# Altium footprint library Connector.PcbLib: 148 footprints (part 6 of 10)
Each footprint in its own frame and in the unit in brackets; x right, y up, seen from the top. Pads: shape width x height; smd on the part's side, far side on the other; paste and mask are expansions set on the pad; w line width, h text height; cw(c..) or ccw(c..) is an arc to the next point about the centre after c.
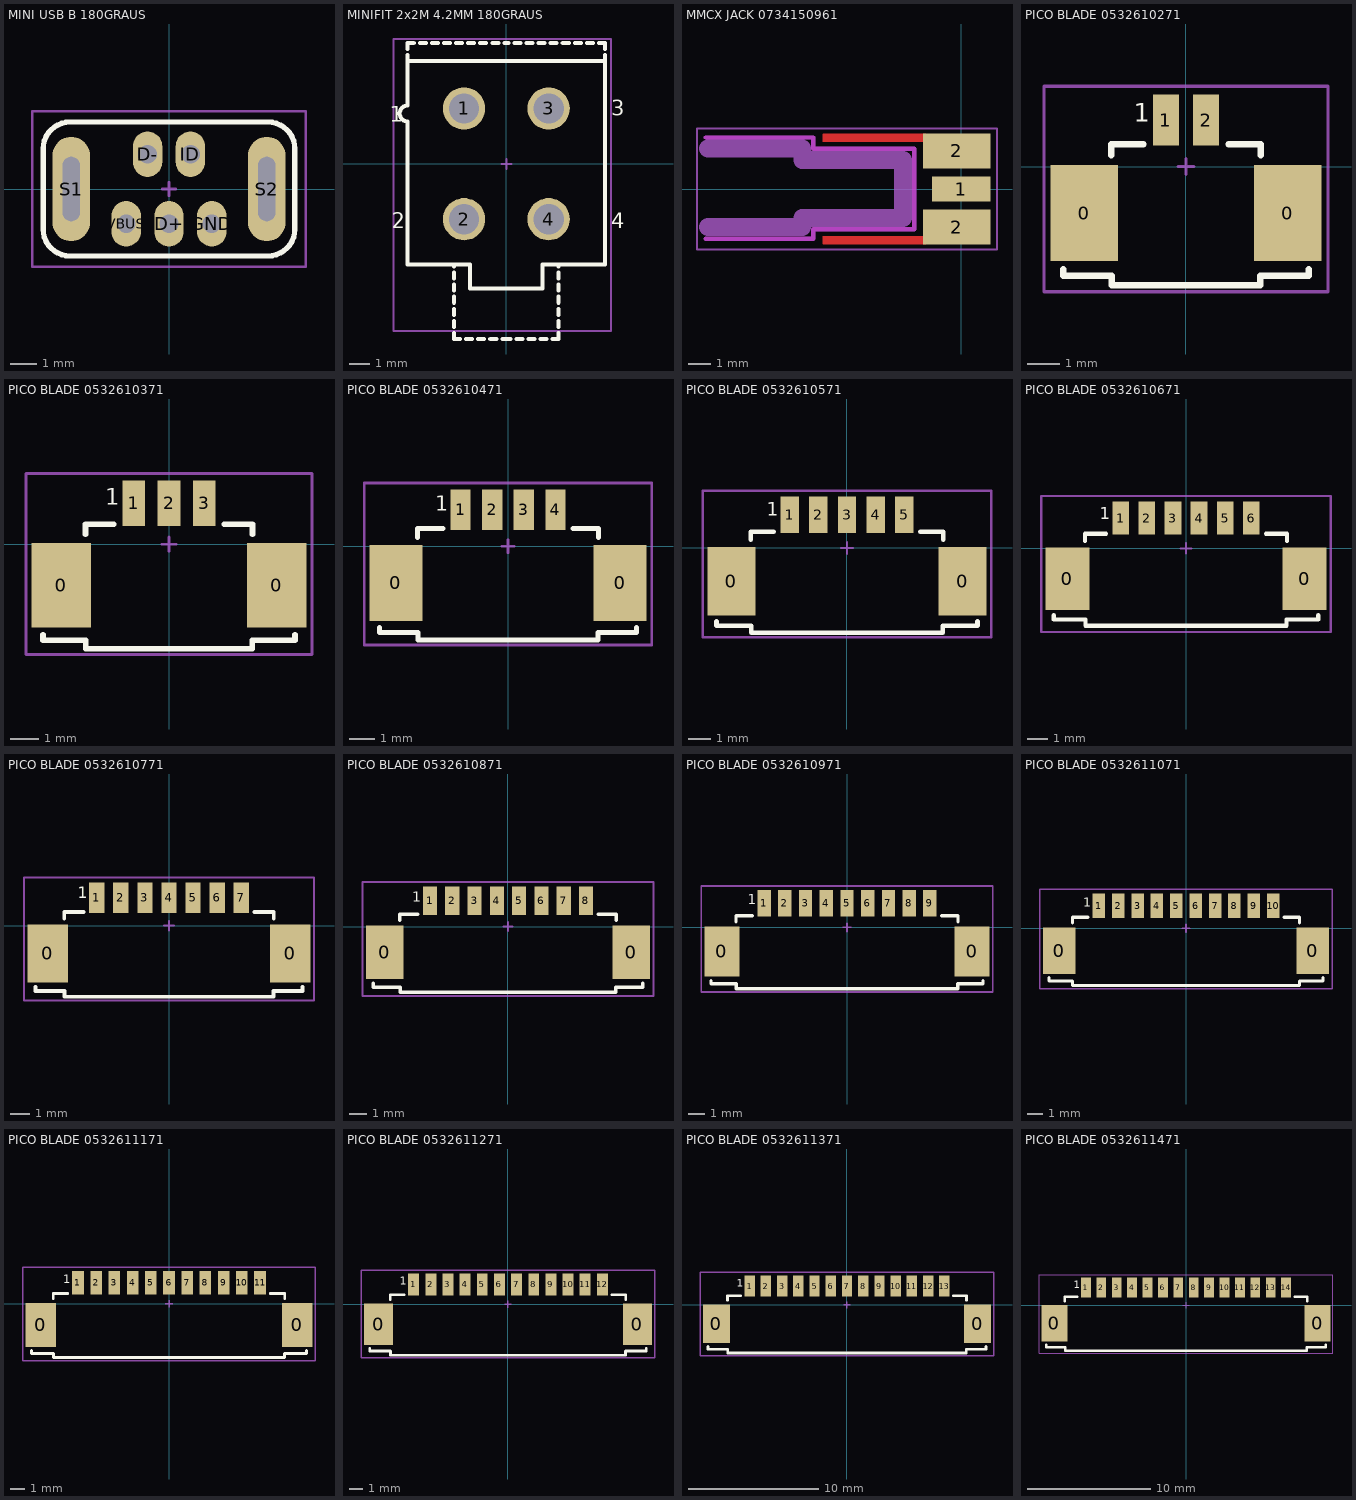
[diagram p5: the footprints below, top view; thin cyan lines are the x and y axes]

## MINI USB B 180GRAUS [mm]
height 6.7
pads (7):
  oval 1.1x1.7 hole 0.7: D+(0,-1.3) D-(-0.8,1.3) GND(1.6,-1.3) ID(0.8,1.3) VBUS(-1.6,-1.3)
  oval 1.4x3.9 hole 0.65 slot 2.4 at 90 deg: S1(-3.65,0) S2(3.65,0)
Top Overlay:
  lines w0.2: -4.7,-1.5 ccw(c-3.7,-1.5) -3.7,-2.5 0,-2.5 3.7,-2.5 ccw(c3.7,-1.5) 4.7,-1.5 4.7,0 4.7,1.5 ccw(c3.7,1.5) 3.7,2.5 0,2.5 -3.7,2.5 ccw(c-3.7,1.5) -4.7,1.5 -4.7,0 -4.7,-1.5
Mechanical 15:
  lines w0.1: -0.25,0 0.25,0 ; 0,-0.25 0,0.25 ; -5.1,-2.9 -5.1,2.9 5.1,2.9 5.1,-2.9 -5.1,-2.9
3D body "User Library-Mini USB UE25BEX510X.STEP": height 7.7, standoff -2.1, extent -3.85,-2.35 3.85,2.35

## MINIFIT 2x2M 4.2MM 180GRAUS [mm]
height 12.8
pads (4):
  round 2.1 hole 1.5: 1(-2.1,2.75) 2(-2.1,-2.75) 3(2.1,2.75) 4(2.1,-2.75)
Top Overlay:
  lines w0.2: -4.9,5.4 -4.9,5.1 ; -4.9,5.7 -4.9,6 -4.6,6 ; -4.3,6 -4,6 ; -3.7,6 -3.4,6 ; -3.1,6 -2.8,6 ; -2.6,-8.4 -2.6,-8.7 -2.3,-8.7 ; -2.6,-8.1 -2.6,-7.8 ; -2.6,-7.5 -2.6,-7.2 ; -2.6,-6.9 -2.6,-6.6 ; -2.6,-6.3 -2.6,-6 ; -2.6,-5.7 -2.6,-5.4 ; -2.6,-5.1 -2.6,-5 ; -2.5,6 -2.2,6 ; -2,-8.7 -1.7,-8.7 ; -1.9,6 -1.6,6 ; -1.4,-8.7 -1.1,-8.7 ; -1.3,6 -1,6 ; -0.8,-8.7 -0.5,-8.7 ; -0.7,6 -0.4,6 ; -0.2,-8.7 0.2,-8.7 ; -0.1,6 0.1,6 ; 0.4,6 0.7,6 ; 0.5,-8.7 0.8,-8.7 ; 1,6 1.3,6 ; 1.1,-8.7 1.4,-8.7 ; 1.6,6 1.9,6 ; 1.7,-8.7 2,-8.7 ; 2.2,6 2.5,6 ; 2.3,-8.7 2.6,-8.7 2.6,-8.4 ; 2.6,-8.1 2.6,-7.8 ; 2.6,-7.5 2.6,-7.2 ; 2.6,-6.9 2.6,-6.6 ; 2.6,-6.3 2.6,-6 ; 2.6,-5.7 2.6,-5.4 ; 2.6,-5.1 2.6,-5 ; 2.8,6 3.1,6 ; 3.4,6 3.7,6 ; 4,6 4.3,6 ; 4.6,6 4.9,6 4.9,5.7 ; 4.9,5.4 4.9,5.1 ; -4.9,5.1 -4.9,2.9 ccw(c-4.9,2.5) -4.9,2.1 -4.9,-5 -1.8,-5 -1.8,-6.2 1.8,-6.2 1.8,-5 4.9,-5 4.9,5.1 ; -4.9,5.1 4.9,5.1
  text "1" at -5.8,2.1 h0.76
  text "2" at -5.7,-3.2 h0.76
  text "3" at 5.2,2.4 h0.76
  text "4" at 5.2,-3.2 h0.76
Mechanical 15:
  lines w0.1: -0.25,0 0.25,0 ; 0,-0.25 0,0.25 ; -5.6,-8.3 5.2,-8.3 5.2,6.2 -5.6,6.2 -5.6,-8.3
3D body "c-1586037-4-b-3d.STEP": height 12.8, standoff -3.5, extent -5.2,-6.075 4.8,4.875
3D body "c-794954-4-d-3d.STEP": height 23.6, standoff 3.6, extent -4.8,-8.6 4.8,5.9

## MMCX JACK 0734150961 [mm]
pads (3):
  rect 2.6x1.1 smd: 1(0,0)
  rect 3x1.55 smd: 2(-0.2,-1.7) 2(-0.2,1.7)
Top Layer:
  rectangle: -6.2,-2.475 -1.6,-2.1
  rectangle: -6.2,2.1 -1.6,2.475
Keep-Out Layer:
  lines w0.2: -11.4,-2.225 -6.6,-2.225 -6.6,-1.8 -2.1,-1.8 -2.1,1.8 -6.6,1.8 -6.6,2.3 -11.4,2.3
Mechanical 1:
  lines w0.2: -11.4,-2.225 -6.6,-2.225 -6.6,-1.8 -2.1,-1.8 -2.1,1.8 -6.6,1.8 -6.6,2.3 -11.4,2.3
Mechanical 3:
  lines w0.8: -11.3,-1.7 -7.1,-1.7 -7.1,-1.3 -2.6,-1.3 -2.6,1.3 -7.1,1.3 -7.1,1.8 -11.3,1.8
Mechanical 15:
  lines w0.1: -0.25,0 0.25,0 ; 0,-0.25 0,0.25 ; -11.8,-2.7 -11.8,2.7 1.6,2.7 1.6,-2.7 -11.8,-2.7
3D body "User Library-mmcx-lr-smt.STEP": height 2.1, standoff -1.41, extent -6.35,-2.235 1.02,2.235

## PICO BLADE 0532610271 [mm]
height 3.4
pads (4):
  rect 2.1x3 smd: 0(-3.175,-1.45) 0(3.175,-1.45)
  rect 0.8x1.6 smd: 1(-0.625,1.45) 2(0.625,1.45)
Top Overlay:
  lines w0.2: -3.825,-3.2 -3.825,-3.4 -2.311,-3.4 -2.311,-3.7 2.311,-3.7 2.311,-3.4 3.825,-3.4 3.825,-3.2 ; -2.325,0.35 -2.325,0.7 -1.325,0.7 ; 1.325,0.7 2.325,0.7 2.325,0.35
  text "1" at -1.625,1.2 h1
Mechanical 15:
  lines w0.1: -0.25,0 0.25,0 ; 0,-0.25 0,0.25 ; -4.425,-3.9 -4.425,2.5 4.425,2.5 4.425,-3.9 -4.425,-3.9
3D body "User Library-molex 53261 white.step": height 3.5, standoff 0, extent -3.825,-3.6 3.825,1.6

## PICO BLADE 0532610371 [mm]
height 3.4
pads (5):
  rect 2.1x3 smd: 0(-3.8,-1.45) 0(3.8,-1.45)
  rect 0.8x1.6 smd: 1(-1.25,1.45) 2(0,1.45) 3(1.25,1.45)
Top Overlay:
  lines w0.2: -4.45,-3.2 -4.45,-3.4 -2.936,-3.4 -2.936,-3.7 2.936,-3.7 2.936,-3.4 4.45,-3.4 4.45,-3.2 ; -2.95,0.35 -2.95,0.7 -1.95,0.7 ; 1.95,0.7 2.95,0.7 2.95,0.35
  text "1" at -2.25,1.2 h1
Mechanical 15:
  lines w0.1: -0.25,0 0.25,0 ; 0,-0.25 0,0.25 ; -5.05,-3.9 -5.05,2.5 5.05,2.5 5.05,-3.9 -5.05,-3.9
3D body "User Library-molex 53261 white (1).step": height 3.5, standoff 0, extent -4.45,-3.6 4.45,1.6

## PICO BLADE 0532610471 [mm]
height 3.4
pads (6):
  rect 2.1x3 smd: 0(-4.425,-1.45) 0(4.425,-1.45)
  rect 0.8x1.6 smd: 1(-1.875,1.45) 2(-0.625,1.45) 3(0.625,1.45) 4(1.875,1.45)
Top Overlay:
  lines w0.2: -5.075,-3.2 -5.075,-3.4 -3.561,-3.4 -3.561,-3.7 3.561,-3.7 3.561,-3.4 5.075,-3.4 5.075,-3.2 ; -3.575,0.35 -3.575,0.7 -2.575,0.7 ; 2.575,0.7 3.575,0.7 3.575,0.35
  text "1" at -2.875,1.2 h1
Mechanical 15:
  lines w0.1: -0.25,0 0.25,0 ; 0,-0.25 0,0.25 ; -5.675,-3.9 -5.675,2.5 5.675,2.5 5.675,-3.9 -5.675,-3.9
3D body "User Library-molex 53261 white (2).step": height 3.5, standoff 0, extent -5.075,-3.6 5.075,1.6

## PICO BLADE 0532610571 [mm]
height 3.4
pads (7):
  rect 2.1x3 smd: 0(-5.05,-1.45) 0(5.05,-1.45)
  rect 0.8x1.6 smd: 1(-2.5,1.45) 2(-1.25,1.45) 3(0,1.45) 4(1.25,1.45) 5(2.5,1.45)
Top Overlay:
  lines w0.2: -5.7,-3.2 -5.7,-3.4 -4.186,-3.4 -4.186,-3.7 4.186,-3.7 4.186,-3.4 5.7,-3.4 5.7,-3.2 ; -4.2,0.35 -4.2,0.7 -3.2,0.7 ; 3.2,0.7 4.2,0.7 4.2,0.35
  text "1" at -3.5,1.2 h1
Mechanical 15:
  lines w0.1: -0.25,0 0.25,0 ; 0,-0.25 0,0.25 ; -6.3,-3.9 -6.3,2.5 6.3,2.5 6.3,-3.9 -6.3,-3.9
3D body "User Library-molex 53261 white (3).step": height 3.5, standoff 0, extent -5.7,-3.6 5.7,1.6

## PICO BLADE 0532610671 [mm]
height 3.4
pads (8):
  rect 2.1x3 smd: 0(-5.675,-1.45) 0(5.675,-1.45)
  rect 0.8x1.6 smd: 1(-3.125,1.45) 2(-1.875,1.45) 3(-0.625,1.45) 4(0.625,1.45) 5(1.875,1.45) 6(3.125,1.45)
Top Overlay:
  lines w0.2: -6.325,-3.2 -6.325,-3.4 -4.811,-3.4 -4.811,-3.7 4.811,-3.7 4.811,-3.4 6.325,-3.4 6.325,-3.2 ; -4.825,0.35 -4.825,0.7 -3.825,0.7 ; 3.825,0.7 4.825,0.7 4.825,0.35
  text "1" at -4.125,1.2 h1
Mechanical 15:
  lines w0.1: -0.25,0 0.25,0 ; 0,-0.25 0,0.25 ; -6.925,-4 6.925,-4 6.925,2.5 -6.925,2.5 -6.925,-4
3D body "User Library-molex 53261 white (4).step": height 3.5, standoff 0, extent -6.325,-3.6 6.325,1.6

## PICO BLADE 0532610771 [mm]
height 3.4
pads (9):
  rect 2.1x3 smd: 0(-6.3,-1.45) 0(6.3,-1.45)
  rect 0.8x1.6 smd: 1(-3.75,1.45) 2(-2.5,1.45) 3(-1.25,1.45) 4(0,1.45) 5(1.25,1.45) 6(2.5,1.45) 7(3.75,1.45)
Top Overlay:
  lines w0.2: -6.95,-3.2 -6.95,-3.4 -5.436,-3.4 -5.436,-3.7 5.436,-3.7 5.436,-3.4 6.95,-3.4 6.95,-3.2 ; -5.45,0.35 -5.45,0.7 -4.45,0.7 ; 4.45,0.7 5.45,0.7 5.45,0.35
  text "1" at -4.75,1.2 h1
Mechanical 15:
  lines w0.1: -0.25,0 0.25,0 ; 0,-0.25 0,0.25 ; -7.55,-3.9 -7.55,2.5 7.55,2.5 7.55,-3.9 -7.55,-3.9
3D body "User Library-molex 53261 white (5).step": height 3.5, standoff 0, extent -6.95,-3.6 6.95,1.6

## PICO BLADE 0532610871 [mm]
height 3.4
pads (10):
  rect 2.1x3 smd: 0(-6.925,-1.45) 0(6.925,-1.45)
  rect 0.8x1.6 smd: 1(-4.375,1.45) 2(-3.125,1.45) 3(-1.875,1.45) 4(-0.625,1.45) 5(0.625,1.45) 6(1.875,1.45) 7(3.125,1.45) 8(4.375,1.45)
Top Overlay:
  lines w0.2: -7.575,-3.2 -7.575,-3.4 -6.061,-3.4 -6.061,-3.7 6.061,-3.7 6.061,-3.4 7.575,-3.4 7.575,-3.2 ; -6.075,0.35 -6.075,0.7 -5.075,0.7 ; 5.075,0.7 6.075,0.7 6.075,0.35
  text "1" at -5.375,1.2 h1
Mechanical 15:
  lines w0.1: -0.25,0 0.25,0 ; 0,-0.25 0,0.25 ; -8.175,-3.9 -8.175,2.5 8.175,2.5 8.175,-3.9 -8.175,-3.9
3D body "User Library-molex 53261 white (6).step": height 3.5, standoff 0, extent -7.575,-3.6 7.575,1.6

## PICO BLADE 0532610971 [mm]
height 3.4
pads (11):
  rect 2.1x3 smd: 0(-7.55,-1.45) 0(7.55,-1.45)
  rect 0.8x1.6 smd: 1(-5,1.45) 2(-3.75,1.45) 3(-2.5,1.45) 4(-1.25,1.45) 5(0,1.45) 6(1.25,1.45) 7(2.5,1.45) 8(3.75,1.45) 9(5,1.45)
Top Overlay:
  lines w0.2: -8.2,-3.2 -8.2,-3.4 -6.686,-3.4 -6.686,-3.7 6.686,-3.7 6.686,-3.4 8.2,-3.4 8.2,-3.2 ; -6.7,0.35 -6.7,0.7 -5.7,0.7 ; 5.7,0.7 6.7,0.7 6.7,0.35
  text "1" at -6,1.2 h1
Mechanical 15:
  lines w0.1: -0.25,0 0.25,0 ; 0,-0.25 0,0.25 ; -8.8,-3.9 -8.8,2.5 8.8,2.5 8.8,-3.9 -8.8,-3.9
3D body "User Library-molex 53261 white (7).step": height 3.5, standoff 0, extent -8.2,-3.6 8.2,1.6

## PICO BLADE 0532611071 [mm]
height 3.4
pads (12):
  rect 2.1x3 smd: 0(-8.175,-1.45) 0(8.175,-1.45)
  rect 0.8x1.6 smd: 1(-5.625,1.45) 2(-4.375,1.45) 3(-3.125,1.45) 4(-1.875,1.45) 5(-0.625,1.45) 6(0.625,1.45) 7(1.875,1.45) 8(3.125,1.45) 9(4.375,1.45) 10(5.625,1.45)
Top Overlay:
  lines w0.2: -8.825,-3.2 -8.825,-3.4 -7.311,-3.4 -7.311,-3.7 7.311,-3.7 7.311,-3.4 8.825,-3.4 8.825,-3.2 ; -7.325,0.35 -7.325,0.7 -6.325,0.7 ; 6.325,0.7 7.325,0.7 7.325,0.35
  text "1" at -6.625,1.2 h1
Mechanical 15:
  lines w0.1: -0.25,0 0.25,0 ; 0,-0.25 0,0.25 ; -9.425,-3.9 9.425,-3.9 9.425,2.5 -9.425,2.5 -9.425,-3.9
3D body "User Library-molex 53261 white (8).step": height 3.5, standoff 0, extent -8.825,-3.6 8.825,1.6

## PICO BLADE 0532611171 [mm]
height 3.4
pads (13):
  rect 2.1x3 smd: 0(-8.8,-1.45) 0(8.8,-1.45)
  rect 0.8x1.6 smd: 1(-6.25,1.45) 2(-5,1.45) 3(-3.75,1.45) 4(-2.5,1.45) 5(-1.25,1.45) 6(0,1.45) 7(1.25,1.45) 8(2.5,1.45) 9(3.75,1.45) 10(5,1.45) 11(6.25,1.45)
Top Overlay:
  lines w0.2: -9.45,-3.2 -9.45,-3.4 -7.936,-3.4 -7.936,-3.7 7.936,-3.7 7.936,-3.4 9.45,-3.4 9.45,-3.2 ; -7.95,0.35 -7.95,0.7 -6.95,0.7 ; 6.95,0.7 7.95,0.7 7.95,0.35
  text "1" at -7.25,1.2 h1
Mechanical 15:
  lines w0.1: -0.25,0 0.25,0 ; 0,-0.25 0,0.25 ; -10.05,-3.9 -10.05,2.5 10.05,2.5 10.05,-3.9 -10.05,-3.9
3D body "User Library-molex 53261 white (9).step": height 3.5, standoff 0, extent -9.45,-3.6 9.45,1.6

## PICO BLADE 0532611271 [mm]
height 3.4
pads (14):
  rect 2.1x3 smd: 0(-9.425,-1.45) 0(9.425,-1.45)
  rect 0.8x1.6 smd: 1(-6.875,1.45) 2(-5.625,1.45) 3(-4.375,1.45) 4(-3.125,1.45) 5(-1.875,1.45) 6(-0.625,1.45) 7(0.625,1.45) 8(1.875,1.45) 9(3.125,1.45) 10(4.375,1.45) 11(5.625,1.45) 12(6.875,1.45)
Top Overlay:
  lines w0.2: -10.075,-3.2 -10.075,-3.4 -8.561,-3.4 -8.561,-3.7 8.561,-3.7 8.561,-3.4 10.075,-3.4 10.075,-3.2 ; -8.575,0.35 -8.575,0.7 -7.575,0.7 ; 7.575,0.7 8.575,0.7 8.575,0.35
  text "1" at -7.875,1.2 h1
Mechanical 15:
  lines w0.1: -0.25,0 0.25,0 ; 0,-0.25 0,0.25 ; -10.675,-3.9 10.675,-3.9 10.675,2.5 -10.675,2.5 -10.675,-3.9
3D body "User Library-molex 53261 white (10).step": height 3.5, standoff 0, extent -10.175,-3.6 9.975,1.6

## PICO BLADE 0532611371 [mm]
height 3.4
pads (15):
  rect 2.1x3 smd: 0(-10.05,-1.45) 0(10.05,-1.45)
  rect 0.8x1.6 smd: 1(-7.5,1.45) 2(-6.25,1.45) 3(-5,1.45) 4(-3.75,1.45) 5(-2.5,1.45) 6(-1.25,1.45) 7(0,1.45) 8(1.25,1.45) 9(2.5,1.45) 10(3.75,1.45) 11(5,1.45) 12(6.25,1.45) 13(7.5,1.45)
Top Overlay:
  lines w0.2: -10.7,-3.2 -10.7,-3.4 -9.186,-3.4 -9.186,-3.7 9.186,-3.7 9.186,-3.4 10.7,-3.4 10.7,-3.2 ; -9.2,0.35 -9.2,0.7 -8.2,0.7 ; 8.2,0.7 9.2,0.7 9.2,0.35
  text "1" at -8.5,1.2 h1
Mechanical 15:
  lines w0.1: -0.25,0 0.25,0 ; 0,-0.25 0,0.25 ; -11.3,-3.9 -11.3,2.5 11.3,2.5 11.3,-3.9 -11.3,-3.9
3D body "User Library-molex 53261 white (11).step": height 3.5, standoff 0, extent -10.7,-3.6 10.7,1.6

## PICO BLADE 0532611471 [mm]
height 3.4
pads (16):
  rect 2.1x3 smd: 0(-10.675,-1.45) 0(10.675,-1.45)
  rect 0.8x1.6 smd: 1(-8.125,1.45) 2(-6.875,1.45) 3(-5.625,1.45) 4(-4.375,1.45) 5(-3.125,1.45) 6(-1.875,1.45) 7(-0.625,1.45) 8(0.625,1.45) 9(1.875,1.45) 10(3.125,1.45) 11(4.375,1.45) 12(5.625,1.45) 13(6.875,1.45) 14(8.125,1.45)
Top Overlay:
  lines w0.2: -11.325,-3.2 -11.325,-3.4 -9.811,-3.4 -9.811,-3.7 9.811,-3.7 9.811,-3.4 11.325,-3.4 11.325,-3.2 ; -9.825,0.35 -9.825,0.7 -8.825,0.7 ; 8.825,0.7 9.825,0.7 9.825,0.35
  text "1" at -9.125,1.2 h1
Mechanical 15:
  lines w0.1: -0.25,0 0.25,0 ; 0,-0.25 0,0.25 ; -11.925,-3.9 -11.925,2.5 11.925,2.5 11.925,-3.9 -11.925,-3.9
3D body "User Library-molex 53261 white (12).step": height 3.5, standoff 0, extent -11.325,-3.6 11.325,1.6